# Altium integrated library Lib_MS_V4.0.IntLib: 296 symbols (part 1 of 2)
Pins are listed as number, name and electrical type; pins without a type are passive.

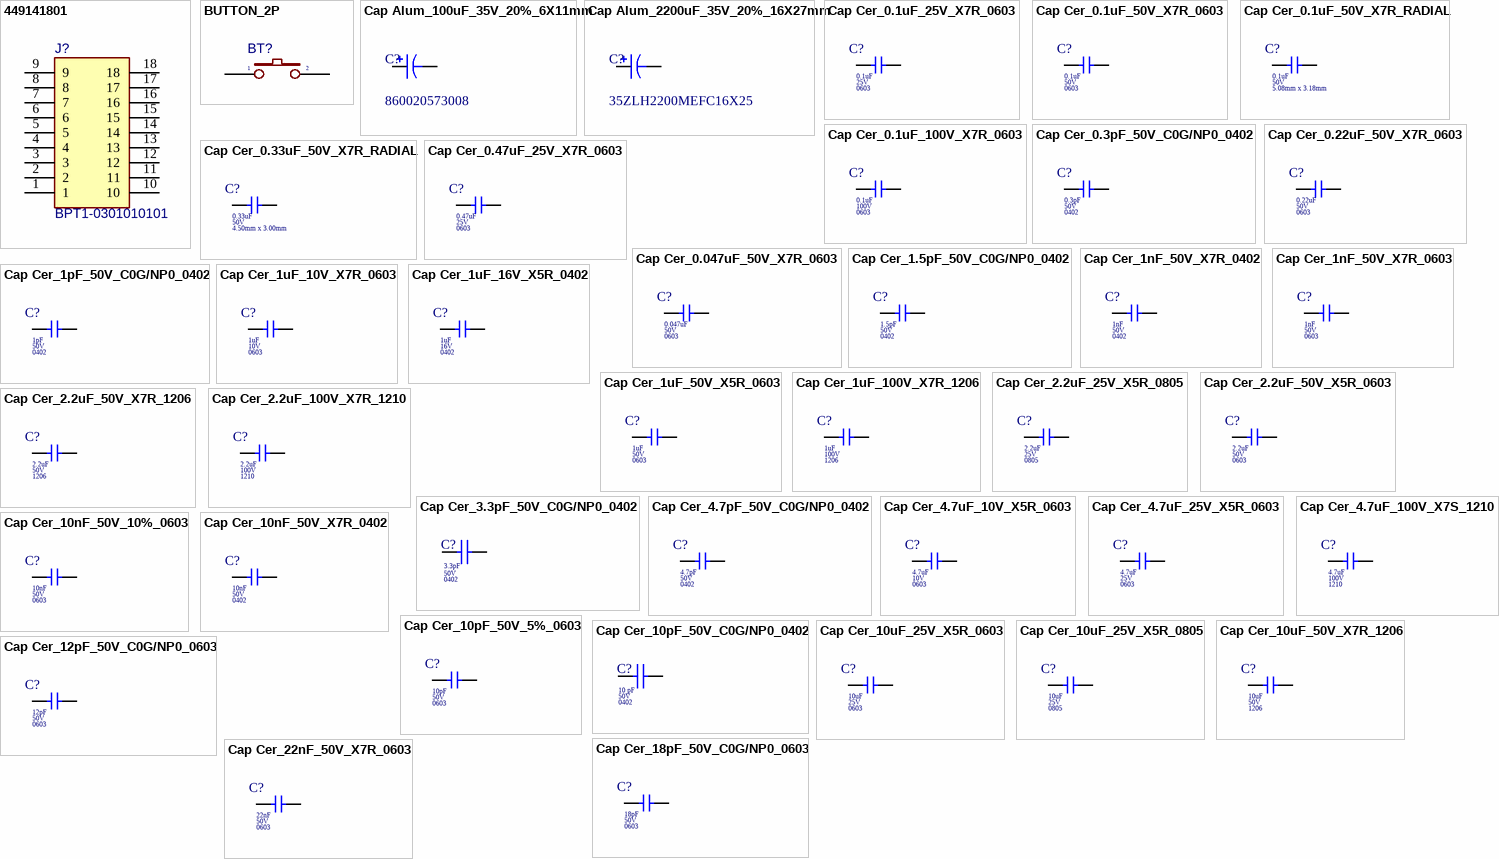
[diagram p0: symbols 449141801 to Cap Cer_22nF_50V_X7R_0603]

## 449141801
designator J?, comment BPT1-0301010101
CONN HEADER VERT 18POS 3MM; Manufacturer: Molex; Part Number: WF3.0-27NAS; Description SEL: CONN HEADER VERT 18POS 3MM; Footprint Type: TH; ComponentLink1Description: DIGIKEY; ComponentLink1URL: https://www.digikey.com/en/products/detail/molex/0449141801/3311268
footprint 44914-1801
pins: 1, 2, 3, 4, 5, 6, 7, 8, 9, 10, 11, 12, 13, 14, 15, 16, 17, 18

## BUTTON_2P
designator BT?  (value not drawn)
TACT 6.0 X 3.5, 2.5 MM H, 180GF,; Manufacturer Part Number: 1502-2(180g); Description SEL: TACT 6.0 X 3.5, 2.5 MM H, 180GF,; Footprint Type: SMD; ComponentLink1Description: CXT; ComponentLink1URL: https://linhkien.cxtvn.com/1779-nut-nhan-smd-2p.html
footprint BUTTON_2P_SMD
pins: 1, 2

## Cap Alum_100uF_35V_20%_6X11mm
designator C?, comment 860020573008
100 µF 35 V Aluminum Electrolytic Capacitors Radial, Can 2000 Hrs @ 105°C; Manufacturer: Würth Elektronik; Capacitance: 100uF; Tolerance: ±20%; Hight: 11mm; Voltage: 35V; Part Number: 860020573008; Dimension: 6mm; ComponentLink1Description: BLK; ComponentLink1URL: https://banlinhkien.com/tu-hoa-100uf-35v-6x11mm-10-chiec-p22441912.html; ComponentLink2Description: DIGIKEY; ComponentLink2URL: https://www.digikey.bg/en/products/detail/w%C3%BCrth-elektronik/860020573008/5727177
footprint CAP ALUM_6X11mm
pins: 1, 2
1 alternate drawing of the same symbol

## Cap Alum_2200uF_35V_20%_16X27mm
designator C?, comment 35ZLH2200MEFC16X25
2200 µF 35 V Aluminum Electrolytic Capacitors Radial, Can 10000 Hrs @ 105°C; Manufacturer: Rubycon; Capacitance: 2200uF; Tolerance: ±20%; Hight: 27mm; Voltage: 35V; Part Number: 35ZLH2200MEFC16X25; Dimension: 16mm; ComponentLink1Description: TGIC; ComponentLink1URL: https://www.thegioiic.com/tu-hoa-2200uf-35v-16x27mm-xuyen-lo; ComponentLink2Description: DIGIKEY; ComponentLink2URL: https://www.digikey.bg/en/products/detail/rubycon/35ZLH2200MEFC16X25/3564493; ComponentLink3Description: BLK; ComponentLink3URL: https://banlinhkien.com/tu-hoa-2200uf-35v-16x25mm-p6646100.html
footprint CAP ALUM_16X27mm
pins: 1, 2
1 alternate drawing of the same symbol

## Cap Cer_0.1uF_25V_X7R_0603
designator C?, comment value 0.1uF  Package: 0603  Voltage: 25V  (hidden comment: CC0603KRX7R8BB104)
CAP CER 0.1UF 25V X7R 0603; ComponentLink1Description: New link; ComponentLink1URL: https://www.digikey.com/en/products/detail/yageo/CC0603KRX7R8BB104/2103079
footprint Cap_0603
pins: 1, 2

## Cap Cer_0.1uF_50V_X7R_0603
designator C?, comment value 0.1uF  Package: 0603  Voltage: 50V  (hidden comment: CL10B104KB8NNNC)
CAP CER 0.1UF 50V X7R 0603; ComponentLink1Description: CXT; ComponentLink1URL: https://linhkien.cxtvn.com/1981-tu-0603-khong-phan-cuc.html; ComponentLink2Description: DIGIKEY; ComponentLink2URL: https://www.digikey.com/en/products/detail/samsung-electro-mechanics/CL10B104KB8NNNC/3886658
footprint Cap_0603
pins: 1, 2

## Cap Cer_0.1uF_50V_X7R_RADIAL
designator C?, comment value 0.1uF  Dimension: 5.08mm x 3.18mm  Voltage: 50V  (hidden comment: C320C104K5R5TA)
0.1 µF ±10% 50V Ceramic Capacitor X7R Radial; ComponentLink1Description: CXT; ComponentLink1URL: https://linhkienchatluong.vn/tu-monolithic---tu-vang/tu-su-vang-104-100nf-01uf-50v-10-10c_sp458_ct14569.aspx; ComponentLink2Description: DIGIKEY; ComponentLink2URL: https://www.digikey.bg/en/products/detail/kemet/C320C104K5R5TA/818040
footprint CAP Cer_RADIAL_5.08mm x 3.18mm
pins: 1, 2

## Cap Cer_0.1uF_100V_X7R_0603
designator C?, comment value 0.1uF  Package: 0603  Voltage: 100V  (hidden comment: CL10B104KC8NNNC)
0.1 µF ±10% 100V Ceramic Capacitor X7R 0603 (1608 Metric); ComponentLink1Description: CXT; ComponentLink1URL: https://linhkien.cxtvn.com/4493-tu-0603-khong-phan-cuc.html; ComponentLink2Description: DIGIKEY; ComponentLink2URL: https://www.digikey.bg/en/products/detail/samsung-electro-mechanics/CL10B104KC8NNNC/5961291
footprint Cap_0603
pins: 1, 2

## Cap Cer_0.3pF_50V_C0G/NP0_0402
designator C?, comment value 0.3pF  Package: 0402  Voltage: 50V  (hidden comment: GJM1555C1HR30WB01D)
CAP CER 0.3PF 50V C0G/NP0 0402; ComponentLink1Description: New link; ComponentLink1URL: https://www.digikey.bg/en/products/detail/murata-electronics/GJM1555C1HR30WB01D/2593245?s=N4IgTCBcDaIOICkCyBGArBgwigEgJQGYAGAdQCEiUAREAXQF8g
footprint Cap_0402
pins: 1, 2

## Cap Cer_0.22uF_50V_X7R_0603
designator C?, comment value 0.22uF  Package: 0603  Voltage: 50V  (hidden comment: GCM188R71H224KA64D)
0.22 µF ±10% 50V Ceramic Capacitor X7R 0603 (1608 Metric); ComponentLink1Description: DIGIKEY; ComponentLink1URL: https://www.digikey.com/en/products/detail/murata-electronics/GCM188R71H224KA64D/2123158
footprint Cap_0603
pins: 1, 2

## Cap Cer_0.33uF_50V_X7R_RADIAL
designator C?, comment value 0.33uF  Dimension: 4.50mm x 3.00mm  Voltage: 50V  (hidden comment: FG24X7R1H334KNT06)
0.33 µF ±10% 50V Ceramic Capacitor X7R Radial; ComponentLink1Description: CXT; ComponentLink1URL: https://linhkienchatluong.vn/tu-monolithic---tu-vang/tu-su-vang-334-330nf-033uf-50v-10c_sp458_ct14571.aspx; ComponentLink2Description: DIGIKEY; ComponentLink2URL: https://www.digikey.bg/en/products/detail/tdk-corporation/FG24X7R1H334KNT06/5802993
footprint CAP CER_RADIAL_4.5X3mm
pins: 1, 2

## Cap Cer_0.47uF_25V_X7R_0603
designator C?, comment value 0.47uF  Package: 0603  Voltage: 25V  (hidden comment: 0603B474K250CT)
0.47 µF ±10% 25V Ceramic Capacitor X7R 0603 (1608 Metric); ComponentLink1Description: CXT; ComponentLink1URL: https://linhkien.cxtvn.com/4765-tu-0603-khong-phan-cuc.html; ComponentLink2Description: DIGIKEY; ComponentLink2URL: https://www.digikey.bg/en/products/detail/walsin-technology-corporation/0603B474K250CT/9354949?s=N4IgTCBcDaIAwDY4GYBCAWA7Og0mArHAMIAqIAugL5A
footprint Cap_0603
pins: 1, 2

## Cap Cer_0.047uF_50V_X7R_0603
designator C?, comment value 0.047uF  Package: 0603  Voltage: 50V  (hidden comment: C1608X7R1H473K080AA)
0.047 µF ±10% 50V Ceramic Capacitor X7R 0603 (1608 Metric); ComponentLink1Description: TGIC; ComponentLink1URL: https://www.thegioiic.com/tu-gom-0603-47nf-50v; ComponentLink2Description: DIGIKEY; ComponentLink2URL: https://www.digikey.bg/en/products/detail/tdk-corporation/C1608X7R1H473K080AA/513823
footprint Cap_0603
pins: 1, 2

## Cap Cer_1.5pF_50V_C0G/NP0_0402
designator C?, comment value 1.5pF  Package: 0402  Voltage: 50V  (hidden comment: RF15N1R5B500CT)
CAP CER 1.5PF 50V C0G/NP0 0402; ComponentLink1Description: CXT; ComponentLink1URL: https://linhkien.cxtvn.com/8768-tu-khong-phan-cuc-0402.html; ComponentLink2Description: MOUSER; ComponentLink2URL: https://www.mouser.com/ProductDetail/Walsin/RF15N1R5B500CT?qs=ZrPdAQfJ6DML5%252BefXykpgg%3D%3D
footprint Cap_0402
pins: 1, 2

## Cap Cer_1nF_50V_X7R_0402
designator C?, comment value 1nF  Package: 0402  Voltage: 50V  (hidden comment: GRM155R71H102KA01D)
CAP CER 1000PF 50V X7R 0402; ComponentLink1Description: CXT; ComponentLink1URL: https://linhkien.cxtvn.com/3435-tu-khong-phan-cuc-0402.html; ComponentLink2Description: DIGIKEY; ComponentLink2URL: https://www.digikey.bg/en/products/detail/murata-electronics/GRM155R71H102KA01D/587225?s=N4IgTCBcDaIOICUCyBGArGhB2FAJFADGANICCBKAIiALoC%2BQA
footprint Cap_0402
pins: 1, 2

## Cap Cer_1nF_50V_X7R_0603
designator C?, comment value 1nF  Package: 0603  Voltage: 50V  (hidden comment: C0603X102K5RAC3316)
CAP CER 0603 1NF 50V X7R 10%; ComponentLink1Description: CXT; ComponentLink1URL: https://linhkien.cxtvn.com/2701-tu-0603-khong-phan-cuc.html; ComponentLink2Description: DIGIKEY; ComponentLink2URL: https://www.digikey.com/en/products/detail/kemet/C0603X102K5RAC3316/10315783
footprint Cap_0603
pins: 1, 2

## Cap Cer_1pF_50V_C0G/NP0_0402
designator C?, comment value 1pF  Package: 0402  Voltage: 50V  (hidden comment: CC0402BRNPO9BN1RO)
CAP CER 1PF 50V C0G/NP0 0402; ComponentLink1Description: New link; ComponentLink1URL: https://linhkien.cxtvn.com/8767-tu-khong-phan-cuc-0402.html
footprint Cap_0402
pins: 1, 2

## Cap Cer_1uF_10V_X7R_0603
designator C?, comment value 1uF  Package: 0603  Voltage: 10V  (hidden comment: CL10B105KP8NNNC)
CAP CER 1UF 10V X7R 0603; ComponentLink1Description: 25V; ComponentLink1URL: https://linhkien.cxtvn.com/11400-tu-0603-khong-phan-cuc.html; ComponentLink2Description: 10V; ComponentLink2URL: https://www.digikey.com/en/products/detail/samsung-electro-mechanics/CL10B105KP8NNNC/3887604
footprint Cap_0603
pins: 1, 2

## Cap Cer_1uF_16V_X5R_0402
designator C?, comment value 1uF  Package: 0402  Voltage: 16V  (hidden comment: GRM155R61C105KA12D)
CAP CER 1UF 16V X5R 0402; ComponentLink1Description: CXT; ComponentLink1URL: https://linhkien.cxtvn.com/4361-tu-khong-phan-cuc-0402.html; ComponentLink2Description: DIGIKEY; ComponentLink2URL: https://www.digikey.bg/en/products/detail/murata-electronics/GRM155R61C105KA12D/4905129?s=N4IgTCBcDaIOICUCyBGArGhA2FBhFADGgNICCKYAIiALoC%2BQA
footprint Cap_0402
pins: 1, 2

## Cap Cer_1uF_50V_X5R_0603
designator C?, comment value 1uF  Package: 0603  Voltage: 50V  (hidden comment: CL10A105KB8NNNC)
CAP CER 1UF 50V X5R 0603; ComponentLink1Description: BLK; ComponentLink1URL: https://banlinhkien.com/tu-0603-1051uf-50v-10-10c-p6646055.html; ComponentLink2Description: DIGIKEY; ComponentLink2URL: https://www.digikey.com/en/products/detail/samsung-electro-mechanics/CL10A105KB8NNNC/3887518?s=N4IgTCBcDaIMIBkCMAGAgqgrAaQEIA4A5YuEAXQF8g
footprint Cap_0603
pins: 1, 2

## Cap Cer_1uF_100V_X7R_1206
designator C?, comment value 1uF  Package: 1206  Voltage: 100V  (hidden comment: 1206B105K101CT)
1 µF ±10% 100V Ceramic Capacitor X7R 1206 (3216 Metric); ComponentLink1Description: CXT; ComponentLink1URL: https://linhkien.cxtvn.com/3027-tu-khong-phan-cuc-1206.html; ComponentLink2Description: DIGIKEY; ComponentLink2URL: https://www.digikey.bg/en/products/detail/walsin-technology-corporation/1206B105K101CT/14836811?s=N4IgTCBcDaIIxgAwDYBCdEFYDSG4GEAVEAXQF8g
footprint Cap_1206
pins: 1, 2

## Cap Cer_2.2uF_25V_X5R_0805
designator C?, comment value 2.2uF  Package: 0805  Voltage: 25V  (hidden comment: 0805X225K250CT)
2.2 µF ±10% 25V Ceramic Capacitor X5R 0805 (2012 Metric); ComponentLink1Description: CXT; ComponentLink1URL: https://linhkien.cxtvn.com/2664-tu-khong-phan-cuc-0805.html; ComponentLink2Description: DIGIKEY; ComponentLink2URL: https://www.digikey.bg/en/products/detail/walsin-technology-corporation/0805X225K250CT/14836825?s=N4IgTCBcDaIAwA44FYAaYzINKbgYQBUQBdAXyA
footprint Cap_0805
pins: 1, 2

## Cap Cer_2.2uF_50V_X5R_0603
designator C?, comment value 2.2uF  Package: 0603  Voltage: 50V  (hidden comment: GRM188R61H225KE11D)
CAP CER 2.2UF 50V X5R 0603; ComponentLink1Description: CXT; ComponentLink1URL: https://linhkien.cxtvn.com/2354-tu-0603-khong-phan-cuc.html; ComponentLink2Description: DIGIKEY; ComponentLink2URL: https://www.digikey.sg/en/products/detail/murata-electronics/GRM188R61H225KE11D/4905363
footprint Cap_0603
pins: 1, 2

## Cap Cer_2.2uF_50V_X7R_1206
designator C?, comment value 2.2uF  Package: 1206  Voltage: 50V  (hidden comment: CL31B225KBHNNNE)
2.2 µF ±10% 50V Ceramic Capacitor X7R 1206 (3216 Metric); ComponentLink1Description: TGIC; ComponentLink1URL: https://www.thegioiic.com/tu-gom-1206-2-2uf-50v; ComponentLink2Description: DIGIKEY; ComponentLink2URL: https://www.digikey.com/en/products/detail/samsung-electro-mechanics/CL31B225KBHNNNE/3886949
footprint Cap_1206
pins: 1, 2

## Cap Cer_2.2uF_100V_X7R_1210
designator C?, comment value 2.2uF  Package: 1210  Voltage: 100V  (hidden comment: CL32B225KCJSNNE)
2.2 µF ±10% 100V Ceramic Capacitor X7R 1210 (3225 Metric); ComponentLink1Description: CXT; ComponentLink1URL: https://linhkien.cxtvn.com/4174-tu-1210-khong-phan-cuc.html; ComponentLink2Description: DIGIKEY; ComponentLink2URL: https://www.digikey.bg/en/products/detail/samsung-electro-mechanics/CL32B225KCJSNNE/3889020
footprint Cap_1210 (Capacitor 1210)
pins: 1, 2

## Cap Cer_3.3pF_50V_C0G/NP0_0402
designator C?, comment value 3.3pF  Package: 0402  Voltage: 50V  (hidden comment: GJM1555C1H3R3WB01D)
CAP CER 3.3PF 50V C0G/NP0 0402; Manufacturer: Murata; Manufacturer_Part_Number: GJM1555C1H3R3WB01D; ComponentLink2Description: LKD; ComponentLink2URL: https://banlinhkiendientu.vn/tu-dan-0402-3-3pf-50v-5-day-10-chiec/; ComponentLink3Description: DIGIKEY; ComponentLink3URL: https://www.digikey.com/en/products/detail/murata-electronics/GJM1555C1H3R3WB01D/2592957?s=N4IgTCBcDaIOICkCyBGArBgwigEgZgCU8B1AIQAYUAREAXQF8g
footprint Cap_0402
pins: 1, 2

## Cap Cer_4.7pF_50V_C0G/NP0_0402
designator C?, comment value 4.7pF  Package: 0402  Voltage: 50V  (hidden comment: C1005NP0479CGTS)
CAP CER 4.7PF 50V C0G/NP0 0402; ComponentLink1Description: LKD; ComponentLink1URL: https://banlinhkiendientu.vn/tu-dan-0402-4-7pf-50v-5-day-10-chiec/; ComponentLink2Description: DIGIKEY; ComponentLink2URL: https://www.digikey.bg/en/products/detail/darfon/C1005NP0479CGTS/15286261?s=N4IgTCBcDaIMIEYAMSCsA5ACkgLAdgE44BxAFQGUQBdAXyA
footprint Cap_0402
pins: 1, 2

## Cap Cer_4.7uF_10V_X5R_0603
designator C?, comment value 4.7uF  Package: 0603  Voltage: 10V  (hidden comment: CL10A475KP8NNNC)
CAP CER 4.7UF 10V X5R 0603; ComponentLink1Description: CXT; ComponentLink1URL: https://linhkien.cxtvn.com/2759-tu-0603-khong-phan-cuc.html; ComponentLink2Description: DIGIKEY; ComponentLink2URL: https://www.digikey.com/en/products/detail/samsung-electro-mechanics/CL10A475KP8NNNC/3886702
footprint Cap_0603
pins: 1, 2

## Cap Cer_4.7uF_25V_X5R_0603
designator C?, comment value 4.7uF  Package: 0603  Voltage: 25V  (hidden comment: GRM188R61E475KE11D)
CAP CER 4.7UF 25V X5R 0603; ComponentLink1Description: TGIC; ComponentLink1URL: https://www.thegioiic.com/tu-gom-0603-4-7uf-25v; ComponentLink2Description: DIGIKEY; ComponentLink2URL: https://www.digikey.com/en/products/detail/murata-electronics/GRM188R61E475KE11D/3900465
footprint Cap_0603
pins: 1, 2

## Cap Cer_4.7uF_100V_X7S_1210
designator C?, comment value 4.7uF  Package: 1210  Voltage: 100V  (hidden comment: GCM32DC72A475KE02L)
4.7 µF ±10% 100V Ceramic Capacitor X7S 1210 (3225 Metric); ComponentLink1Description: CXT 50V; ComponentLink1URL: https://linhkien.cxtvn.com/3437-tu-1210-khong-phan-cuc.html; ComponentLink2Description: DIGIKEY; ComponentLink2URL: https://www.digikey.bg/en/products/detail/murata-electronics/GCM32DC72A475KE02L/6606113?s=N4IgTCBcDaIAQHEDCBZAzGAIkg7GAggCw4CsA0gKIAMYAMiALoC%2BQA
footprint Cap_1210 (Capacitor 1210)
pins: 1, 2

## Cap Cer_10nF_50V_10%_0603
designator C?, comment value 10nF  Package: 0603  Voltage: 50V  (hidden comment: 06035A103KAT2A)
CAP CER 10nF 50V 10% 0603; ComponentLink1Description: CXT; ComponentLink1URL: https://linhkien.cxtvn.com/2353-tu-0603-khong-phan-cuc.html; ComponentLink2Description: MOUSER; ComponentLink2URL: https://www.mouser.com/ProductDetail/KYOCERA-AVX/06035A103KAT2A?qs=sGAEpiMZZMukHu%252BjC5l7Yb5oPaw27JT5ryvJSzX08SI%3D
footprint Cap_0603
pins: 1, 2

## Cap Cer_10nF_50V_X7R_0402
designator C?, comment value 10nF  Package: 0402  Voltage: 50V  (hidden comment: GRM155R71H103KA88D)
CAP CER 10000PF 50V X7R 0402; ComponentLink1Description: CXT; ComponentLink1URL: https://linhkien.cxtvn.com/4360-tu-khong-phan-cuc-0402.html; ComponentLink2Description: DIGIKEY; ComponentLink2URL: https://www.digikey.bg/en/products/detail/murata-electronics/GRM155R71H103KA88D/1033252?s=N4IgTCBcDaIOICUCyBGArGhB2FAJFADAMwDSAggBwUAiIAugL5A
footprint Cap_0402
pins: 1, 2

## Cap Cer_10pF_50V_5%_0603
designator C?, comment value 10pF  Package: 0603  Voltage: 50V  (hidden comment: 0603N100J500CT)
CAP CER 10pF 50V 5% 0603; ComponentLink1Description: CXT; ComponentLink1URL: https://linhkien.cxtvn.com/4432-tu-0603-khong-phan-cuc.html; ComponentLink2Description: DIGIKEY; ComponentLink2URL: https://www.digikey.com/en/products/detail/walsin-technology-corporation/0603N100J500CT/9354968
footprint Cap_0603
pins: 1, 2

## Cap Cer_10pF_50V_C0G/NP0_0402
designator C?, comment value 10 pF  Package: 0402  Voltage: 50V  (hidden comment: GJM1555C1H100FB01D)
CAP CER 10PF 50V C0G/NP0 0402; Manufacturer: MURATA; Manufacturer_Part_Number: GJM1555C1H100FB01D; ComponentLink1Description: CXT; ComponentLink1URL: https://linhkien.cxtvn.com/2909-tu-khong-phan-cuc-0402.html; ComponentLink2Description: DIGIKEY; ComponentLink2URL: https://www.digikey.com/en/products/detail/murata-electronics/GJM1555C1H100FB01D/2592845?s=N4IgTCBcDaIOICkCyBGArBgwigEigDPgGIBC%2BKAIiALoC%2BQA
footprint Cap_0402
pins: 1, 2

## Cap Cer_10uF_25V_X5R_0603
designator C?, comment value 10uF  Package: 0603  Voltage: 25V  (hidden comment: CL10A106MA8NRNC)
CAP CER 10UF 25V X5R 0603; ComponentLink1Description: CXT; ComponentLink1URL: https://linhkien.cxtvn.com/2886-tu-0603-khong-phan-cuc.html; ComponentLink2Description: DIGIKEY; ComponentLink2URL: https://www.digikey.com/en/products/detail/samsung-electro-mechanics/CL10A106MA8NRNC/3887527
footprint Cap_0603
pins: 1, 2

## Cap Cer_10uF_25V_X5R_0805
designator C?, comment value 10uF  Package: 0805  Voltage: 25V  (hidden comment: CL21A106KAYNNNE)
10 µF ±10% 25V Ceramic Capacitor X5R 0805 (2012 Metric); ComponentLink1Description: CXT; ComponentLink1URL: https://linhkien.cxtvn.com/1978-tu-khong-phan-cuc-0805.html; ComponentLink2Description: DIGIKEY; ComponentLink2URL: https://www.digikey.bg/en/products/detail/samsung-electro-mechanics/CL21A106KAYNNNE/3888549?s=N4IgTCBcDaIMIBkwEYCCyAMA2A0qgmgHLECiIAugL5A
footprint Cap_0805
pins: 1, 2

## Cap Cer_10uF_50V_X7R_1206
designator C?, comment value 10uF  Package: 1206  Voltage: 50V  (hidden comment: CL31B106KBHNNNE)
CAP CER 10UF 50V X7R 1206; ComponentLink1Description: CXT; ComponentLink1URL: https://linhkien.cxtvn.com/8778-tu-khong-phan-cuc-1206.html; ComponentLink2Description: DIGIKEY; ComponentLink2URL: https://www.digikey.com/en/products/detail/samsung-electro-mechanics/CL31B106KBHNNNE/5961251
footprint Cap_1206
pins: 1, 2

## Cap Cer_12pF_50V_C0G/NP0_0603
designator C?, comment value 12pF  Package: 0603  Voltage: 50V  (hidden comment: 0603N120J500CT)
12 pF ±5% 50V Ceramic Capacitor C0G, NP0 0603 (1608 Metric); ComponentLink1Description: CXT; ComponentLink1URL: https://linhkien.cxtvn.com/1980-tu-0603-khong-phan-cuc.html; ComponentLink2Description: DIGIKEY; ComponentLink2URL: https://www.digikey.bg/en/products/detail/walsin-technology-corporation/0603N120J500CT/9354977?s=N4IgTCBcDaIAwDY4GYByBGMcBSBWOcAwgCogC6AvkA
footprint Cap_0603
pins: 1, 2

## Cap Cer_18pF_50V_C0G/NP0_0603
designator C?, comment value 18pF  Package: 0603  Voltage: 50V  (hidden comment: 0603N180J500CT)
18 pF ±5% 50V Ceramic Capacitor C0G, NP0 0603 (1608 Metric); ComponentLink1Description: CXT; ComponentLink1URL: https://linhkien.cxtvn.com/2397-tu-0603-khong-phan-cuc.html; ComponentLink2Description: DIGIKEY; ComponentLink2URL: https://www.digikey.bg/en/products/detail/walsin-technology-corporation/0603N180J500CT/9354991?s=N4IgTCBcDaIAwDY4GYByBGAHHAUgVjjgGEAVEAXQF8g
footprint Cap_0603
pins: 1, 2

## Cap Cer_22nF_50V_X7R_0603
designator C?, comment value 22nF  Package: 0603  Voltage: 50V  (hidden comment: CL10B223KB8NNNC)
CAP CER 0.022UF 50V X7R 0603; ComponentLink1Description: CXT; ComponentLink1URL: https://linhkien.cxtvn.com/2513-tu-0603-khong-phan-cuc.html; ComponentLink2Description: DIGIKEY; ComponentLink2URL: https://www.digikey.bg/en/products/detail/samsung-electro-mechanics/CL10B223KB8NNNC/3886762?s=N4IgTCBcDaIMIBkCMAGAQmMBmA0mgHAHLFwgC6AvkA
footprint Cap_0603
pins: 1, 2

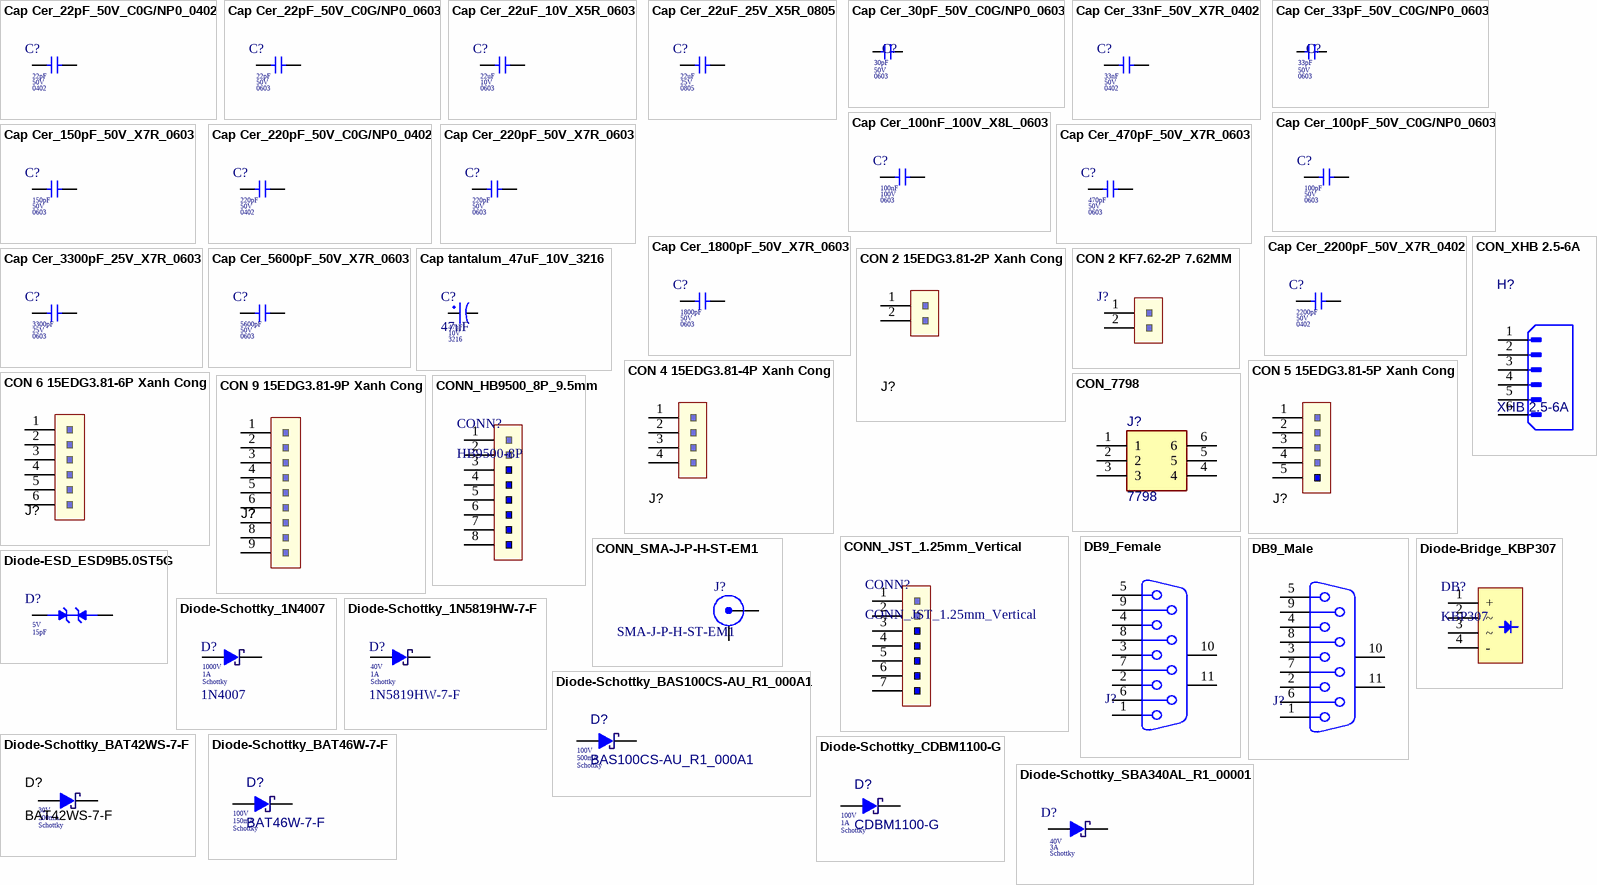
[diagram p1: symbols Cap Cer_22pF_50V_C0G/NP0_0402 to Diode-Schottky_SBA340AL_R1_00001]

## Cap Cer_22pF_50V_C0G/NP0_0402
designator C?, comment value 22pF  Package: 0402  Voltage: 50V  (hidden comment: 0402N220F500CT)
CAP CER 22PF 50V C0G/NP0 0402; ComponentLink1Description: CXT; ComponentLink1URL: https://linhkien.cxtvn.com/4210-tu-khong-phan-cuc-0402.html; ComponentLink2Description: DIGIKEY; ComponentLink2URL: https://www.digikey.bg/en/products/detail/walsin-technology-corporation/0402N220F500CT/9354777?s=N4IgTCBcDaIAwBY5gHJjHAYgVjnAwgCogC6AvkA
footprint Cap_0402
pins: 1, 2

## Cap Cer_22pF_50V_C0G/NP0_0603
designator C?, comment value 22pF  Package: 0603  Voltage: 50V  (hidden comment: C0603C220J5GACTU)
CAP CER 22PF 50V C0G/NP0 0603; ComponentLink1Description: CXT; ComponentLink1URL: https://linhkien.cxtvn.com/2697-tu-0603-khong-phan-cuc.html; ComponentLink2Description: DIGIKEY; ComponentLink2URL: https://www.digikey.com/en/products/detail/kemet/C0603C220J5GACTU/411055?s=N4IgTCBcDaIMIAYBsCDMcxgQKQKwHEBBOAFQFUQBdAXyA
footprint Cap_0603
pins: 1, 2

## Cap Cer_22uF_10V_X5R_0603
designator C?, comment value 22uF  Package: 0603  Voltage: 10V  (hidden comment: CL10A226MP8NUNE)
CAP CER 22UF 10V X5R 0603; ComponentLink1Description: CXT; ComponentLink1URL: https://linhkien.cxtvn.com/4556-tu-0603-khong-phan-cuc.html; ComponentLink2Description: DIGIKEY; ComponentLink2URL: https://www.digikey.com/en/products/detail/samsung-electro-mechanics/CL10A226MP8NUNE/3886932
footprint Cap_0603
pins: 1, 2

## Cap Cer_22uF_25V_X5R_0805
designator C?, comment value 22uF  Package: 0805  Voltage: 25V  (hidden comment: CL21A226MAYNNNE)
CAP CER 22UF 25V X5R 0805; ComponentLink1Description: LKCL; ComponentLink1URL: https://linhkienchatluong.vn/tu-dan-0805/tu-dan-0805-226-22uf-25v-20-10c_sp1293_ct16943.aspx; ComponentLink2Description: DIGIKEY; ComponentLink2URL: https://www.digikey.com/en/products/detail/samsung-electro-mechanics/CL21A226MAYNNNE/10479857
footprint Cap_0805
pins: 1, 2

## Cap Cer_30pF_50V_C0G/NP0_0603
designator C?, comment Capacitance: 30pF  Voltage: 50V  Package: 0603  (hidden comment: 0603N300J500CT)
CAP CER 30PF 50V C0G/NP0 0603; Manufacture 1: Walsin Technology Corporation; Mouting Type: SMD; Type: CAP-CER; Temp Coef: C0G,NP0; Tolerance: 5%; Manufacture Part Number 1: 0603N300J500CT; MSL: 1; Temperature: -55°C ~ 125°C; ComponentLink1Description: CXT; ComponentLink1URL: https://linhkien.cxtvn.com/10945-tu-30pf-0603-50v-10-10c.html/page-92; ComponentLink2Description: DIGIKEY; ComponentLink2URL: https://www.digikey.bg/en/products/detail/walsin-technology-corporation/0603N300J500CT/9355012
footprint Cap_0603
pins: 1, 2

## Cap Cer_33nF_50V_X7R_0402
designator C?, comment value 33nF  Package: 0402  Voltage: 50V  (hidden comment: CC0402KRX7R9BB333)
CAP CER 0.033UF 50V X7R 0402; ComponentLink1Description: LKD; ComponentLink1URL: https://banlinhkiendientu.vn/tu-dan-0402-333-33nf-50v-10-day-10-chiec/; ComponentLink2Description: DIGIKEY; ComponentLink2URL: https://www.digikey.bg/en/products/detail/yageo/CC0402KRX7R9BB333/11491014?s=N4IgTCBcDaIMJwAwBZFgNICUAaB2TAnAEJEDM5IAugL5A
footprint Cap_0402
pins: 1, 2

## Cap Cer_33pF_50V_C0G/NP0_0603
designator C?, comment Capacitance: 33pF  Voltage: 50V  Package: 0603  (hidden comment: 0603N330J500CT)
CAP-CER,SMD;33pF,5%,0603,50V,C0G,NP0; Manufacture 1: Walsin Technology Corporation; Manufacture Part Number 1: 0603N330J500CT; Mouting Type: SMD; MSL: 1; Temperature: -55°C ~ 125°C; Type: CAP-CER; Temp Coef: C0G,NP0; Tolerance: 5%; ComponentLink1Description: CXT; ComponentLink1URL: https://linhkien.cxtvn.com/3426-tu-0603-khong-phan-cuc.html; ComponentLink2Description: DIGIKEY; ComponentLink2URL: https://www.digikey.gr/en/products/detail/walsin-technology-corporation/0603N330J500CT/6707550?s=N4IgTCBcDaIAwDY4GYByzlwFIFY5wGEAVEAXQF8g
footprint Cap_0603
pins: 1, 2

## Cap Cer_100nF_100V_X8L_0603
designator C?, comment value 100nF  Voltage: 100V  Package: 0603  (hidden comment: CL10E104KC8VPNC)
CAP CER 100NF 100V X8L 0603; ComponentLink1Description: CXT; ComponentLink1URL: https://linhkien.cxtvn.com/4493-tu-0603-khong-phan-cuc.html; ComponentLink2Description: DIGIKEY; ComponentLink2URL: https://www.digikey.com/en/products/detail/samsung-electro-mechanics/CL10E104KC8VPNC/20498486
footprint Cap_0603
pins: 1, 2

## Cap Cer_100pF_50V_C0G/NP0_0603
designator C?, comment value 100pF  Package: 0603  Voltage: 50V  (hidden comment: GRM1885C1H101JA01D)
CAP CER 100PF 50V C0G/NP0 0603; ComponentLink1Description: CXT; ComponentLink1URL: https://linhkien.cxtvn.com/2825-tu-0603-khong-phan-cuc.html; ComponentLink2Description: DIGIKEY; ComponentLink2URL: https://www.digikey.com/en/products/detail/murata-electronics/GRM1885C1H101JA01D/586921
footprint Cap_0603
pins: 1, 2

## Cap Cer_150pF_50V_X7R_0603
designator C?, comment value 150pF  Package: 0603  Voltage: 50V  (hidden comment: KGM15AR71H151JT)
150 pF ±5% 50V Ceramic Capacitor X7R 0603 (1608 Metric); ComponentLink1Description: CXT; ComponentLink2Description: DIGIKEY; ComponentLink2URL: https://www.digikey.bg/en/products/detail/kyocera-avx/KGM15AR71H151JT/1600060
footprint Cap_0603
pins: 1, 2

## Cap Cer_220pF_50V_C0G/NP0_0402
designator C?, comment value 220pF  Package: 0402  Voltage: 50V  (hidden comment: GCM1555C1H221JA16D)
CAP CER 220PF 50V C0G/NP0 0402; ComponentLink1Description: CXT; ComponentLink1URL: https://linhkien.cxtvn.com/2908-tu-khong-phan-cuc-0402.html; ComponentLink2Description: DIGIKEY; ComponentLink2URL: https://www.digikey.bg/en/products/detail/murata-electronics/GCM1555C1H221JA16D/1765175?s=N4IgTCBcDaIOIGECyBGArBhKASYwoCkBBFANgBEQBdAXyA
footprint Cap_0402
pins: 1, 2

## Cap Cer_220pF_50V_X7R_0603
designator C?, comment value 220pF  Package: 0603  Voltage: 50V  (hidden comment: 0603B221K500CT)
CAP CER 220pF 50V X7R 0603; ComponentLink1Description: CXT; ComponentLink1URL: https://linhkien.cxtvn.com/2913-tu-0603-khong-phan-cuc.html; ComponentLink2Description: DIGIKEY; ComponentLink2URL: https://www.digikey.com/en/products/detail/walsin-technology-corporation/0603B221K500CT/9354904
footprint Cap_0603
pins: 1, 2

## Cap Cer_470pF_50V_X7R_0603
designator C?, comment value 470pF  Package: 0603  Voltage: 50V  (hidden comment: VJ0603Y471KXACW1BC)